# Altium footprint library Electronic Devices_LIB.PcbLib: 410 footprints (part 18 of 26)
Each footprint in its own frame and in the unit in brackets; x right, y up, seen from the top. Pads: shape width x height; smd on the part's side, far side on the other; paste and mask are expansions set on the pad; w line width, h text height; cw(c..) or ccw(c..) is an arc to the next point about the centre after c.
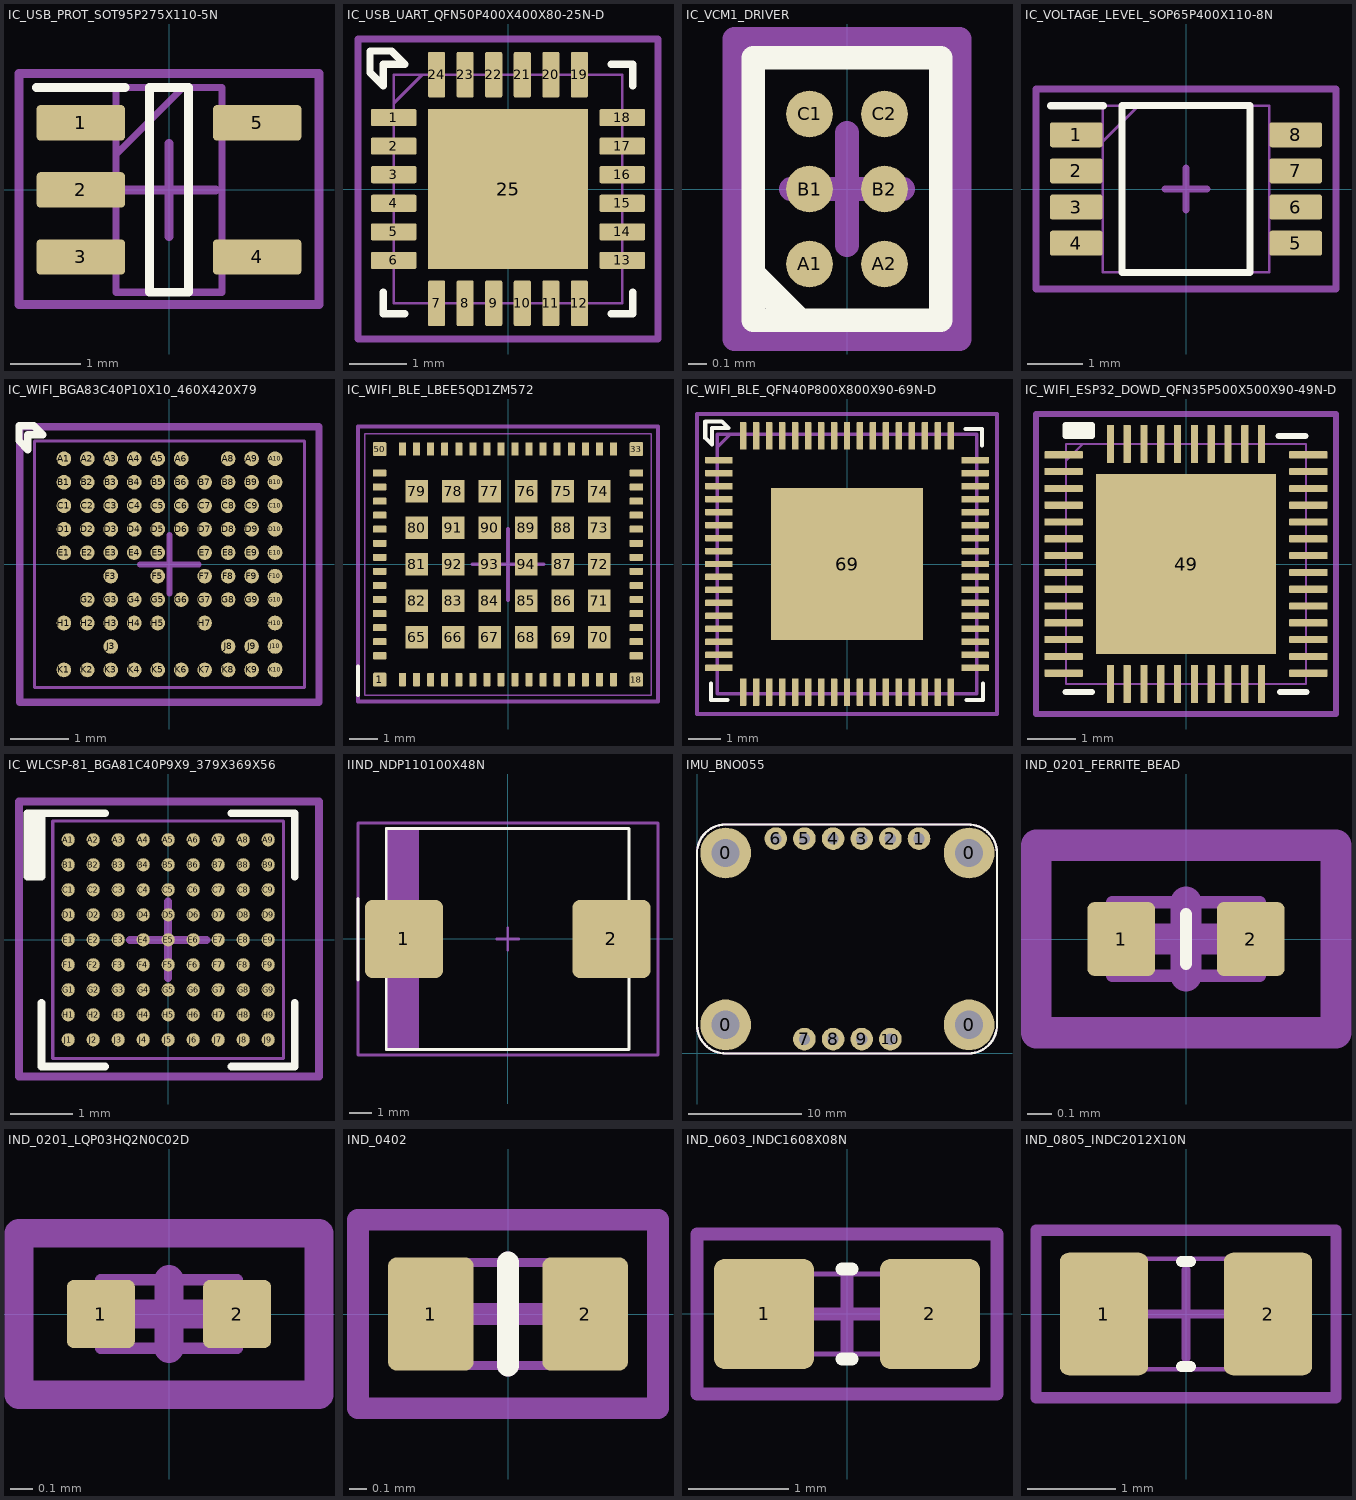
[diagram p17: the footprints below, top view; thin cyan lines are the x and y axes]

## IC_USB_PROT_SOT95P275X110-5N [mm]
pads (5):
  rrect20% 1.25x0.5 smd: 1(-1.25,0.95) 2(-1.25,0) 3(-1.25,-0.95) 4(1.25,-0.95) 5(1.25,0.95)
Top Overlay:
  lines w0.127: -1.875,1.45 -0.625,1.45 ; -0.275,-1.45 -0.275,1.45 0.275,1.45 0.275,-1.45 -0.275,-1.45
Top Assembly:
  text ".Designator" at -2.515,-0.212 h0.51
Top Courtyard:
  lines w0.127: -0.66,0 0,0 ; 0,-0.66 0,0 ; 0,0.66 0,0 ; 0.66,0 0,0 ; -2.125,-1.626 -2.125,1.651 2.125,1.651 2.125,-1.626 -2.125,-1.626
Top 3D Body:
  lines w0.1: -0.75,0.5 0.2,1.45 ; -0.75,-1.45 -0.75,1.45 0.75,1.45 0.75,-1.45 -0.75,-1.45
3D body "74AHC1G04GV,125.stp": height 1, standoff 0, extent -1.394,-1.477 1.394,1.473

## IC_USB_UART_QFN50P400X400X80-25N-D [mm] "24-QFN (4x4)"
height 0.8
pads (25):
  rrect20% 0.8x0.3 smd: 1(-2,1.25) 2(-2,0.75) 3(-2,0.25) 4(-2,-0.25) 5(-2,-0.75) 6(-2,-1.25) 13(2,-1.25) 14(2,-0.75) 15(2,-0.25) 16(2,0.25) 17(2,0.75) 18(2,1.25)
  rrect20% 0.3x0.8 smd: 7(-1.25,-2) 8(-0.75,-2) 9(-0.25,-2) 10(0.25,-2) 11(0.75,-2) 12(1.25,-2) 19(1.25,2) 20(0.75,2) 21(0.25,2) 22(-0.25,2) 23(-0.75,2) 24(-1.25,2)
  rect 2.8x2.8 smd: 25(0,0)
Top Overlay:
  lines w0.127: -2.184,-1.803 -2.184,-2.184 -1.803,-2.184 ; 1.803,-2.184 2.184,-2.184 2.184,-1.803 ; 1.803,2.184 2.184,2.184 2.184,1.803 ; -2.413,2.032 -2.413,2.413 -2.032,2.413 -1.803,2.184 -2.184,2.184 -2.184,1.803 -2.413,2.032
Top Assembly:
  lines w0.051: -2,1.5 -1.5,2 ; -2,-2 2,-2 2,2 -2,2 -2,-2
  text ".Designator" at -2.642,-0.009 h0.51
Top Courtyard:
  lines w0.127: -0.584,0 0,0 ; 0,-0.584 0,0 ; 0,0.584 0,0 ; 0.584,0 0,0 ; -2.625,-2.625 -2.625,2.625 2.625,2.625 2.625,-2.625 -2.625,-2.625
3D body "CP2105-F01-GM.stp": height 0.8, standoff 0, extent -2.05,-2.05 2.05,2.05

## IC_VCM1_DRIVER [mm] "6-XFBGA, CSPBGA"
height 0.36
pads (6):
  round 0.25 smd mask+0.051: A1(-0.2,-0.4) A2(0.2,-0.4) B1(-0.2,0) B2(0.2,0) C1(-0.2,0.4) C2(0.2,0.4)
Top Overlay:
  lines w0.127: -0.5,-0.7 0.2,-0.7 0.5,-0.7 0.5,0.7 -0.5,0.7 -0.5,-0.7
  lines w0.15: -0.483,-0.483 -0.279,-0.686
Top Courtyard:
  lines w0.127: -0.3,0 0,0 ; 0,-0.3 0,0 ; 0,0.3 0,0 ; 0.3,0 0,0 ; -0.6,-0.8 -0.6,0.8 0.6,0.8 0.6,-0.8 -0.6,-0.8
3D body "MAX17220ENT+T.STEP": height 0.5, standoff 0, extent -0.443,-0.708 0.443,0.708

## IC_VOLTAGE_LEVEL_SOP65P400X110-8N [mm] "8-TSSOP"
height 0.5
pads (8):
  rrect20% 0.95x0.45 smd: 1(-1.975,0.975) 2(-1.975,0.325) 3(-1.975,-0.325) 4(-1.975,-0.975) 5(1.975,-0.975) 6(1.975,-0.325) 7(1.975,0.325) 8(1.975,0.975)
Top Overlay:
  lines w0.127: -2.438,1.499 -1.488,1.499 ; -1.15,-1.5 -1.15,1.5 1.15,1.5 1.15,-1.5 -1.15,-1.5
Top Assembly:
  lines w0.051: -1.5,0.85 -0.85,1.5 ; -1.5,-1.5 -1.5,1.5 1.5,1.5 1.5,-1.5 -1.5,-1.5
  text ".Designator" at -2.642,-0.085 h0.51
Top Courtyard:
  lines w0.127: -0.381,0 0,0 ; 0,-0.381 0,0 ; 0,0.381 0,0 ; 0.381,0 0,0 ; -2.7,-1.8 -2.7,1.8 2.7,1.8 2.7,-1.8 -2.7,-1.8
3D body "NTS0102DP,125.stp": height 1.1, standoff 0, extent -2,-1.5 2,1.5

## IC_WIFI_BGA83C40P10X10_460X420X79 [mm] "BGA, 83-Leads, Body 4.60x4.20mmx0.79mm, Pitch 0.40mm"
height 0.79
pads (84):
  round 0.25 smd: A1(-1.8,1.8) A2(-1.4,1.8) A3(-1,1.8) A4(-0.6,1.8) A5(-0.2,1.8) A6(0.2,1.8) A8(1,1.8) A9(1.4,1.8) A10(1.8,1.8) B1(-1.8,1.4) B2(-1.4,1.4) B3(-1,1.4) B4(-0.6,1.4) B5(-0.2,1.4) B6(0.2,1.4) B7(0.6,1.4) B8(1,1.4) B9(1.4,1.4) B10(1.8,1.4) C1(-1.8,1) C2(-1.4,1) C3(-1,1) C4(-0.6,1) C5(-0.2,1) C6(0.2,1) C7(0.6,1) C8(1,1) C9(1.4,1) C10(1.8,1) D1(-1.8,0.6) D2(-1.4,0.6) D3(-1,0.6) D4(-0.6,0.6) D5(-0.2,0.6) D6(0.2,0.6) D7(0.6,0.6) D8(1,0.6) D9(1.4,0.6) D10(1.8,0.6) E1(-1.8,0.2) E2(-1.4,0.2) E3(-1,0.2) E4(-0.6,0.2) E5(-0.2,0.2) E7(0.6,0.2) E8(1,0.2) E9(1.4,0.2) E10(1.8,0.2) F3(-1,-0.2) F5(-0.2,-0.2) F7(0.6,-0.2) F8(1,-0.2) F9(1.4,-0.2) F10(1.8,-0.2) G2(-1.4,-0.6) G3(-1,-0.6) G4(-0.6,-0.6) G5(-0.2,-0.6) G6(0.2,-0.6) G7(0.6,-0.6) G8(1,-0.6) G9(1.4,-0.6) G10(1.8,-0.6) H1(-1.8,-1) H2(-1.4,-1) H3(-1,-1) H4(-0.6,-1) H5(-0.2,-1) H7(0.6,-1) H10(1.8,-1) J3(-1,-1.4) J8(1,-1.4) J9(1.4,-1.4) J10(1.8,-1.4) K1(-1.8,-1.8) K2(-1.4,-1.8) K3(-1,-1.8) K4(-0.6,-1.8) K5(-0.2,-1.8) K6(0.2,-1.8) K7(0.6,-1.8) K8(1,-1.8) K9(1.4,-1.8) K10(1.8,-1.8)
Top Overlay:
  lines w0.127: -2.565,2.108 -2.413,1.956 -2.413,2.21 -2.159,2.21 -2.311,2.362 -2.565,2.362 -2.565,2.108
Top Assembly:
  lines w0.051: -2.3,-2.1 2.3,-2.1 2.3,2.1 -2.3,2.1 -2.3,-2.1
  text ".Designator" at -2.692,-0.186 h0.51
Top Courtyard:
  lines w0.1: -0.5,0 0.5,0 ; 0,-0.5 0,0.5
  lines w0.127: -2.55,-2.35 2.55,-2.35 2.55,2.35 -2.55,2.35 -2.55,-2.35
3D body "88W8987-A2-EAHE_AZ.stp": height 0.74, standoff -0.01, extent -2.3,-2.108 2.3,2.092

## IC_WIFI_BLE_LBEE5QD1ZM572 [mm]
pads (94):
  rrect20% 0.475x0.5 smd: 1(-4.563,-4.1) 18(4.563,-4.1) 33(4.563,4.1) 50(-4.563,4.1)
  rrect20% 0.25x0.475 smd: 2(-3.75,-4.1) 3(-3.25,-4.1) 4(-2.75,-4.1) 5(-2.25,-4.1) 6(-1.75,-4.1) 7(-1.25,-4.1) 8(-0.75,-4.1) 9(-0.25,-4.1) 10(0.25,-4.1) 11(0.75,-4.1) 12(1.25,-4.1) 13(1.75,-4.1) 14(2.25,-4.1) 15(2.75,-4.1) 16(3.25,-4.1) 17(3.75,-4.1) 34(3.75,4.1) 35(3.25,4.1) 36(2.75,4.1) 37(2.25,4.1) 38(1.75,4.1) 39(1.25,4.1) 40(0.75,4.1) 41(0.25,4.1) 42(-0.25,4.1) 43(-0.75,4.1) 44(-1.25,4.1) 45(-1.75,4.1) 46(-2.25,4.1) 47(-2.75,4.1) 48(-3.25,4.1) 49(-3.75,4.1)
  rrect20% 0.475x0.25 smd: 19(4.563,-3.25) 20(4.563,-2.75) 21(4.563,-2.25) 22(4.563,-1.75) 23(4.563,-1.25) 24(4.563,-0.75) 25(4.563,-0.25) 26(4.563,0.25) 27(4.563,0.75) 28(4.563,1.25) 29(4.563,1.75) 30(4.563,2.25) 31(4.563,2.75) 32(4.563,3.25) 51(-4.563,3.25) 52(-4.563,2.75) 53(-4.563,2.25) 54(-4.563,1.75) 55(-4.563,1.25) 56(-4.563,0.75) 57(-4.563,0.25) 58(-4.563,-0.25) 59(-4.563,-0.75) 60(-4.563,-1.25) 61(-4.563,-1.75) 62(-4.563,-2.25) 63(-4.563,-2.75) 64(-4.563,-3.25)
  rect 0.8x0.8 smd: 65(-3.25,-2.6) 66(-1.95,-2.6) 67(-0.65,-2.6) 68(0.65,-2.6) 69(1.95,-2.6) 70(3.25,-2.6) 71(3.25,-1.3) 72(3.25,0) 73(3.25,1.3) 74(3.25,2.6) 75(1.95,2.6) 76(0.65,2.6) 77(-0.65,2.6) 78(-1.95,2.6) 79(-3.25,2.6) 80(-3.25,1.3) 81(-3.25,0) 82(-3.25,-1.3) 83(-1.95,-1.3) 84(-0.65,-1.3) 85(0.65,-1.3) 86(1.95,-1.3) 87(1.95,0) 88(1.95,1.3) 89(0.65,1.3) 90(-0.65,1.3) 91(-1.95,1.3) 92(-1.95,0) 93(-0.65,0) 94(0.65,0)
Top Overlay:
  lines w0.127: -5.334,-4.648 -5.334,-3.632
Top Assembly:
  lines w0.051: -5.1,-4.65 5.1,-4.65 5.1,4.65 -5.1,4.65 -5.1,-4.65
  text ".Designator" at -2.362,-0.415 h0.51
Top Courtyard:
  lines w0.127: -1.27,0 0,0 ; 0,-1.27 0,0 ; 0,1.27 0,0 ; 1.27,0 0,0 ; -5.334,-4.877 -5.334,4.902 5.334,4.902 5.334,-4.877 -5.334,-4.877
3D body "LBEE5QD1ZM-572.stp": height 1.45, standoff 0, extent -5.1,-4.65 5.1,4.65

## IC_WIFI_BLE_QFN40P800X800X90-69N-D [mm] "68-VFQFN Exposed Pad"
height 0.5
pads (69):
  rrect20% 0.85x0.2 smd: 1(-3.95,3.2) 2(-3.95,2.8) 3(-3.95,2.4) 4(-3.95,2) 5(-3.95,1.6) 6(-3.95,1.2) 7(-3.95,0.8) 8(-3.95,0.4) 9(-3.95,0) 10(-3.95,-0.4) 11(-3.95,-0.8) 12(-3.95,-1.2) 13(-3.95,-1.6) 14(-3.95,-2) 15(-3.95,-2.4) 16(-3.95,-2.8) 17(-3.95,-3.2) 35(3.95,-3.2) 36(3.95,-2.8) 37(3.95,-2.4) 38(3.95,-2) 39(3.95,-1.6) 40(3.95,-1.2) 41(3.95,-0.8) 42(3.95,-0.4) 43(3.95,0) 44(3.95,0.4) 45(3.95,0.8) 46(3.95,1.2) 47(3.95,1.6) 48(3.95,2) 49(3.95,2.4) 50(3.95,2.8) 51(3.95,3.2)
  rrect20% 0.2x0.85 smd: 18(-3.2,-3.95) 19(-2.8,-3.95) 20(-2.4,-3.95) 21(-2,-3.95) 22(-1.6,-3.95) 23(-1.2,-3.95) 24(-0.8,-3.95) 25(-0.4,-3.95) 26(0,-3.95) 27(0.4,-3.95) 28(0.8,-3.95) 29(1.2,-3.95) 30(1.6,-3.95) 31(2,-3.95) 32(2.4,-3.95) 33(2.8,-3.95) 34(3.2,-3.95) 52(3.2,3.95) 53(2.8,3.95) 54(2.4,3.95) 55(2,3.95) 56(1.6,3.95) 57(1.2,3.95) 58(0.8,3.95) 59(0.4,3.95) 60(0,3.95) 61(-0.4,3.95) 62(-0.8,3.95) 63(-1.2,3.95) 64(-1.6,3.95) 65(-2,3.95) 66(-2.4,3.95) 67(-2.8,3.95) 68(-3.2,3.95)
  rect 4.7x4.7 smd: 69(0,0)
Top Overlay:
  lines w0.127: -4.191,-3.683 -4.191,-4.191 -3.683,-4.191 ; 3.658,4.166 4.166,4.166 4.166,3.658 ; 3.683,-4.191 4.191,-4.191 4.191,-3.683 ; -4.369,3.886 -4.369,4.394 -3.861,4.394 -3.658,4.191 -4.166,4.191 -4.166,3.683 -4.369,3.886
Top Assembly:
  text ".Designator" at -2.464,-0.186 h0.51
Top Courtyard:
  lines w0.127: -0.914,0 0,0 ; 0,-0.914 0,0 ; 0,0.914 0,0 ; 0.914,0 0,0 ; -4.625,-4.625 -4.625,4.625 4.625,4.625 4.625,-4.625 -4.625,-4.625
Top 3D Body:
  lines w0.1: -4,3.6 -3.6,4 ; -4,-4 -4,4 4,4 4,-4 -4,-4
3D body "88W8987-A2-NYEI_AZ.stp": height 0.9, standoff 0, extent -4.05,-4.05 4.05,4.05

## IC_WIFI_ESP32_DOWD_QFN35P500X500X90-49N-D [mm] "48-QFN (5x5)"
height 0.9
pads (49):
  rrect20% 0.8x0.15 smd: 1(-2.55,2.275) 2(-2.55,1.925) 3(-2.55,1.575) 4(-2.55,1.225) 5(-2.55,0.875) 6(-2.55,0.525) 7(-2.55,0.175) 8(-2.55,-0.175) 9(-2.55,-0.525) 10(-2.55,-0.875) 11(-2.55,-1.225) 12(-2.55,-1.575) 13(-2.55,-1.925) 14(-2.55,-2.275) 25(2.55,-2.275) 26(2.55,-1.925) 27(2.55,-1.575) 28(2.55,-1.225) 29(2.55,-0.875) 30(2.55,-0.525) 31(2.55,-0.175) 32(2.55,0.175) 33(2.55,0.525) 34(2.55,0.875) 35(2.55,1.225) 36(2.55,1.575) 37(2.55,1.925) 38(2.55,2.275)
  rrect20% 0.15x0.8 smd: 15(-1.575,-2.5) 16(-1.225,-2.5) 17(-0.875,-2.5) 18(-0.525,-2.5) 19(-0.175,-2.5) 20(0.175,-2.5) 21(0.525,-2.5) 22(0.875,-2.5) 23(1.225,-2.5) 24(1.575,-2.5) 39(1.575,2.5) 40(1.225,2.5) 41(0.875,2.5) 42(0.525,2.5) 43(0.175,2.5) 44(-0.175,2.5) 45(-0.525,2.5) 46(-0.875,2.5) 47(-1.225,2.5) 48(-1.575,2.5)
  rect 3.75x3.75 smd: 49(0,0)
Top Overlay:
  rectangle: -2.515,2.667 -1.956,2.896
  lines w0.127: -2.515,-2.667 -1.956,-2.667 ; 1.93,2.667 2.489,2.667 ; 1.956,-2.667 2.515,-2.667 ; -2.515,2.667 -2.515,2.896 -1.956,2.896 -1.956,2.667 -2.515,2.667
Top Assembly:
  lines w0.051: -2.5,2.15 -2.15,2.5 ; -2.5,-2.5 2.5,-2.5 2.5,2.5 -2.5,2.5 -2.5,-2.5
  text ".Designator" at -2.54,-0.085 h0.51
Top Courtyard:
  lines w0.127: -0.66,0 0,0 ; 0,-0.66 0,0 ; 0,0.66 0,0 ; 0.66,0 0,0 ; -3.125,-3.125 3.125,-3.125 3.125,3.125 -3.125,3.125 -3.125,-3.125
3D body "ESP32-D0WD-V3.stp": height 0.9, standoff 0, extent -2.55,-2.55 2.55,2.55

## IC_WLCSP-81_BGA81C40P9X9_379X369X56 [mm] "81-PIN WLCSP"
pads (81):
  round 0.21 smd mask+0.05: A1(-1.6,1.6) A2(-1.2,1.6) A3(-0.8,1.6) A4(-0.4,1.6) A5(0,1.6) A6(0.4,1.6) A7(0.8,1.6) A8(1.2,1.6) A9(1.6,1.6) B1(-1.6,1.2) B2(-1.2,1.2) B3(-0.8,1.2) B4(-0.4,1.2) B5(0,1.2) B6(0.4,1.2) B7(0.8,1.2) B8(1.2,1.2) B9(1.6,1.2) C1(-1.6,0.8) C2(-1.2,0.8) C3(-0.8,0.8) C4(-0.4,0.8) C5(0,0.8) C6(0.4,0.8) C7(0.8,0.8) C8(1.2,0.8) C9(1.6,0.8) D1(-1.6,0.4) D2(-1.2,0.4) D3(-0.8,0.4) D4(-0.4,0.4) D5(0,0.4) D6(0.4,0.4) D7(0.8,0.4) D8(1.2,0.4) D9(1.6,0.4) E1(-1.6,0) E2(-1.2,0) E3(-0.8,0) E4(-0.4,0) E5(0,0) E6(0.4,0) E7(0.8,0) E8(1.2,0) E9(1.6,0) F1(-1.6,-0.4) F2(-1.2,-0.4) F3(-0.8,-0.4) F4(-0.4,-0.4) F5(0,-0.4) F6(0.4,-0.4) F7(0.8,-0.4) F8(1.2,-0.4) F9(1.6,-0.4) G1(-1.6,-0.8) G2(-1.2,-0.8) G3(-0.8,-0.8) G4(-0.4,-0.8) G5(0,-0.8) G6(0.4,-0.8) G7(0.8,-0.8) G8(1.2,-0.8) G9(1.6,-0.8) H1(-1.6,-1.2) H2(-1.2,-1.2) H3(-0.8,-1.2) H4(-0.4,-1.2) H5(0,-1.2) H6(0.4,-1.2) H7(0.8,-1.2) H8(1.2,-1.2) H9(1.6,-1.2) J1(-1.6,-1.6) J2(-1.2,-1.6) J3(-0.8,-1.6) J4(-0.4,-1.6) J5(0,-1.6) J6(0.4,-1.6) J7(0.8,-1.6) J8(1.2,-1.6) J9(1.6,-1.6)
Top Overlay:
  rectangle: -2.254,1.012 -2.025,2.025
  lines w0.127: -2.025,-1.012 -2.025,-2.025 -1.012,-2.025 ; -1.012,2.025 -2.025,2.025 ; 1.012,-2.025 2.025,-2.025 2.025,-1.012 ; 1.012,2.025 2.025,2.025 2.025,1.012 ; -2.025,2.025 -2.025,1.012 -2.254,1.012 -2.254,2.025 -2.025,2.025
Top Assembly:
  lines w0.051: -1.847,-1.899 -1.847,1.899 1.847,1.899 1.847,-1.899 -1.847,-1.899
  text ".Designator" at -2.591,-0.212 h0.51
Top Courtyard:
  lines w0.127: -0.61,0 0,0 ; 0,-0.61 0,0 ; 0,0.61 0,0 ; 0.61,0 0,0 ; -2.388,-2.184 2.413,-2.184 2.413,2.21 -2.388,2.21 -2.388,-2.184

## IIND_NDP110100X48N [mm] "Precision Wire Wound Inductor, 2-Leads, Body 11.00x10.00mm, IPC Medium Density"
height 4.8
pads (2):
  rrect20% 3.55x3.55 smd: 1(-4.7,0) 2(4.7,0)
Top Overlay:
  lines w0.127: -6.782,-1.854 -6.782,1.829 ; -5.5,-1.663 -5.5,-5 5.5,-5 5.5,-1.663 ; -5.5,1.663 -5.5,5 5.5,5 5.5,1.663
Top Assembly:
  rectangle: -5.5,-5 -4.02,5
  lines w0.051: -5.5,-5 5.5,-5 5.5,5 -5.5,5 -5.5,-5
  text ".Designator" at -2.489,-0.161 h0.51
Top Courtyard:
  lines w0.127: -0.5,0 0.5,0 ; 0,-0.5 0,0.5 ; -6.782,-5.25 6.807,-5.25 6.807,5.25 -6.782,5.25 -6.782,-5.25
3D body "IIND_NDP110100X48N.step": height 4.9, standoff 0, extent -5.6,-5 5.6,5

## IMU_BNO055 [mm]
pads (14):
  round 4.5 hole 2.5: 0(2.54,2.54) 0(2.54,17.78) 0(24.13,2.54) 0(24.13,17.78)
  round 2 hole 1: 1(19.685,19.05) 2(17.145,19.05) 3(14.605,19.05) 4(12.065,19.05) 5(9.525,19.05) 6(6.985,19.05) 7(9.525,1.27) 8(12.065,1.27) 9(14.605,1.27) 10(17.145,1.27)
Top Overlay:
  lines w0.2: 0,2.5 ccw(c2.55,2.55) 2.6,0 24.1,0 ccw(c24.05,2.55) 26.6,2.6 26.6,17.8 ccw(c24.05,17.75) 24,20.3 2.5,20.3 ccw(c2.55,17.75) 0,17.7 0,2.5
Mechanical 1:
  circle w0.2: c6.985,19.05 r0.5
  circle w0.2: c9.525,19.05 r0.5
  circle w0.2: c24.13,2.54 r1.25
  circle w0.2: c24.13,17.78 r1.25
  circle w0.2: c2.54,17.78 r1.25
  circle w0.2: c2.54,2.54 r1.282
  circle w0.2: c12.065,19.05 r0.5
  circle w0.2: c14.605,19.05 r0.5
  circle w0.2: c17.145,19.05 r0.5
  circle w0.2: c19.685,19.05 r0.5
  circle w0.2: c9.525,1.27 r0.5
  circle w0.2: c12.065,1.27 r0.5
  circle w0.2: c14.605,1.27 r0.5
  circle w0.2: c17.145,1.27 r0.5
  lines w0.2: 0,2.5 ccw(c2.55,2.55) 2.6,0 24.1,0 ccw(c24.05,2.55) 26.6,2.6 26.6,17.8 ccw(c24.05,17.75) 24,20.3 2.5,20.3 ccw(c2.55,17.75) 0,17.7 0,2.5
3D body "Adafruit_BNO055_AP214.STEP": height 6.65, standoff 2.45, extent 0,0 26.67,20.32
3D body "6-Pin Header - Male - 2.54mm.step": height 5.65, standoff -6.29, extent 5.715,17.78 20.955,20.32

## IND_0201_FERRITE_BEAD [mm] "0.024\" L x 0.012\" W (0.60mm x 0.30mm)"
height 0.33
pads (2):
  rrect20% 0.275x0.3 smd: 1(-0.263,0) 2(0.263,0)
Top Overlay:
  lines w0.05: 0,-0.1 0,0.1
Top Assembly:
  lines w0.051: -0.3,-0.15 0.3,-0.15 0.3,0.15 -0.3,0.15 -0.3,-0.15
  text ".Designator" at -2.311,-0.11 h0.51
Top Courtyard:
  lines w0.127: -0.15,0 0,0 ; 0,-0.15 0,0 ; 0,0.15 0,0 ; 0.15,0 0,0 ; -0.61,-0.381 0.61,-0.381 0.61,0.381 -0.61,0.381 -0.61,-0.381
3D body "BLM03AX241SN1D.stp": height 0.3, standoff 0, extent -0.3,-0.15 0.3,0.15

## IND_0201_LQP03HQ2N0C02D [mm] "0.024\" L x 0.012\" W (0.60mm x 0.30mm)"
height 0.41
pads (2):
  rrect20% 0.3x0.3 smd: 1(-0.3,0) 2(0.3,0)
Top Assembly:
  lines w0.051: -0.3,-0.15 -0.3,0.15 0.3,0.15 0.3,-0.15 -0.3,-0.15
  text ".Designator" at -2.362,-0.161 h0.51
Top Courtyard:
  lines w0.127: -0.152,0 0,0 ; 0,-0.152 0,0 ; 0,0.152 0,0 ; 0.152,0 0,0 ; -0.66,-0.356 -0.66,0.356 0.66,0.356 0.66,-0.356 -0.66,-0.356
3D body "LQP03HQ2N0C02D.STEP": height 0.43, standoff 0.01, extent -0.3,-0.15 0.3,0.15

## IND_0402 [mm] "0.039\" L x 0.024\" W (1.00mm x 0.60mm)"
height 0.6
pads (2):
  rrect20% 0.5x0.66 smd: 1(-0.45,0) 2(0.45,0)
Top Overlay:
  lines w0.127: 0,-0.3 0,0.3
Top Assembly:
  lines w0.051: -0.5,-0.3 0.5,-0.3 0.5,0.3 -0.5,0.3 -0.5,-0.3
  text ".Designator" at -2.449,-0.13 h0.51
Top Courtyard:
  lines w0.127: -0.3,0 0,0 ; 0,-0.3 0,0 ; 0,0.3 0,0 ; 0.3,0 0,0 ; -0.875,-0.55 -0.875,0.55 0.875,0.55 0.875,-0.55 -0.875,-0.55
3D body "LQW15AN3N9C00D.stp": height 0.6, standoff 0, extent -0.5,-0.25 0.5,0.25

## IND_0603_INDC1608X08N [mm] "Chip Inductor, 2-Leads, Body 1.60x0.80mm, IPC Medium Density"
height 0.8
pads (2):
  rrect20% 1x1.1 smd: 1(-0.83,0) 2(0.83,0)
Top Overlay:
  lines w0.127: -0.05,-0.45 0.05,-0.45 ; -0.05,0.45 0.05,0.45
Top Assembly:
  lines w0.051: -0.8,-0.4 0.8,-0.4 0.8,0.4 -0.8,0.4 -0.8,-0.4
  text ".Designator" at -2.413,-0.136 h0.51
Top Courtyard:
  lines w0.127: -0.4,0 0.4,0 ; 0,-0.4 0,0.4 ; -1.5,-0.8 1.5,-0.8 1.5,0.8 -1.5,0.8 -1.5,-0.8
3D body "LQW18AN33NJ10D.STEP": height 1.01, standoff 0.01, extent -0.8,-0.4 0.8,0.4

## IND_0805_INDC2012X10N [mm] "Chip Inductor, 2-Leads, Body 2.00x1.25mm, IPC Medium Density"
height 1
pads (2):
  rrect20% 1x1.39 smd: 1(-0.93,0) 2(0.93,0)
Top Overlay:
  lines w0.127: -0.05,-0.595 0.05,-0.595 ; -0.05,0.595 0.05,0.595
Top Assembly:
  lines w0.051: -1,-0.625 -1,0.625 1,0.625 1,-0.625 -1,-0.625
  text ".Designator" at -2.464,-0.11 h0.51
Top Courtyard:
  lines w0.1: -0.5,0 0.5,0 ; 0,-0.5 0,0.5
  lines w0.127: -1.7,-0.95 -1.7,0.95 1.7,0.95 1.7,-0.95 -1.7,-0.95
3D body "IND_0805_INDC2012X10N.step": height 1, standoff 0, extent -1,-0.625 1,0.625